# Altium schematic symbol library SparkFun.SCHLIB: 796 symbols (part 1 of 5) (continued)
## BUTTONPAD-4X4 (continued)
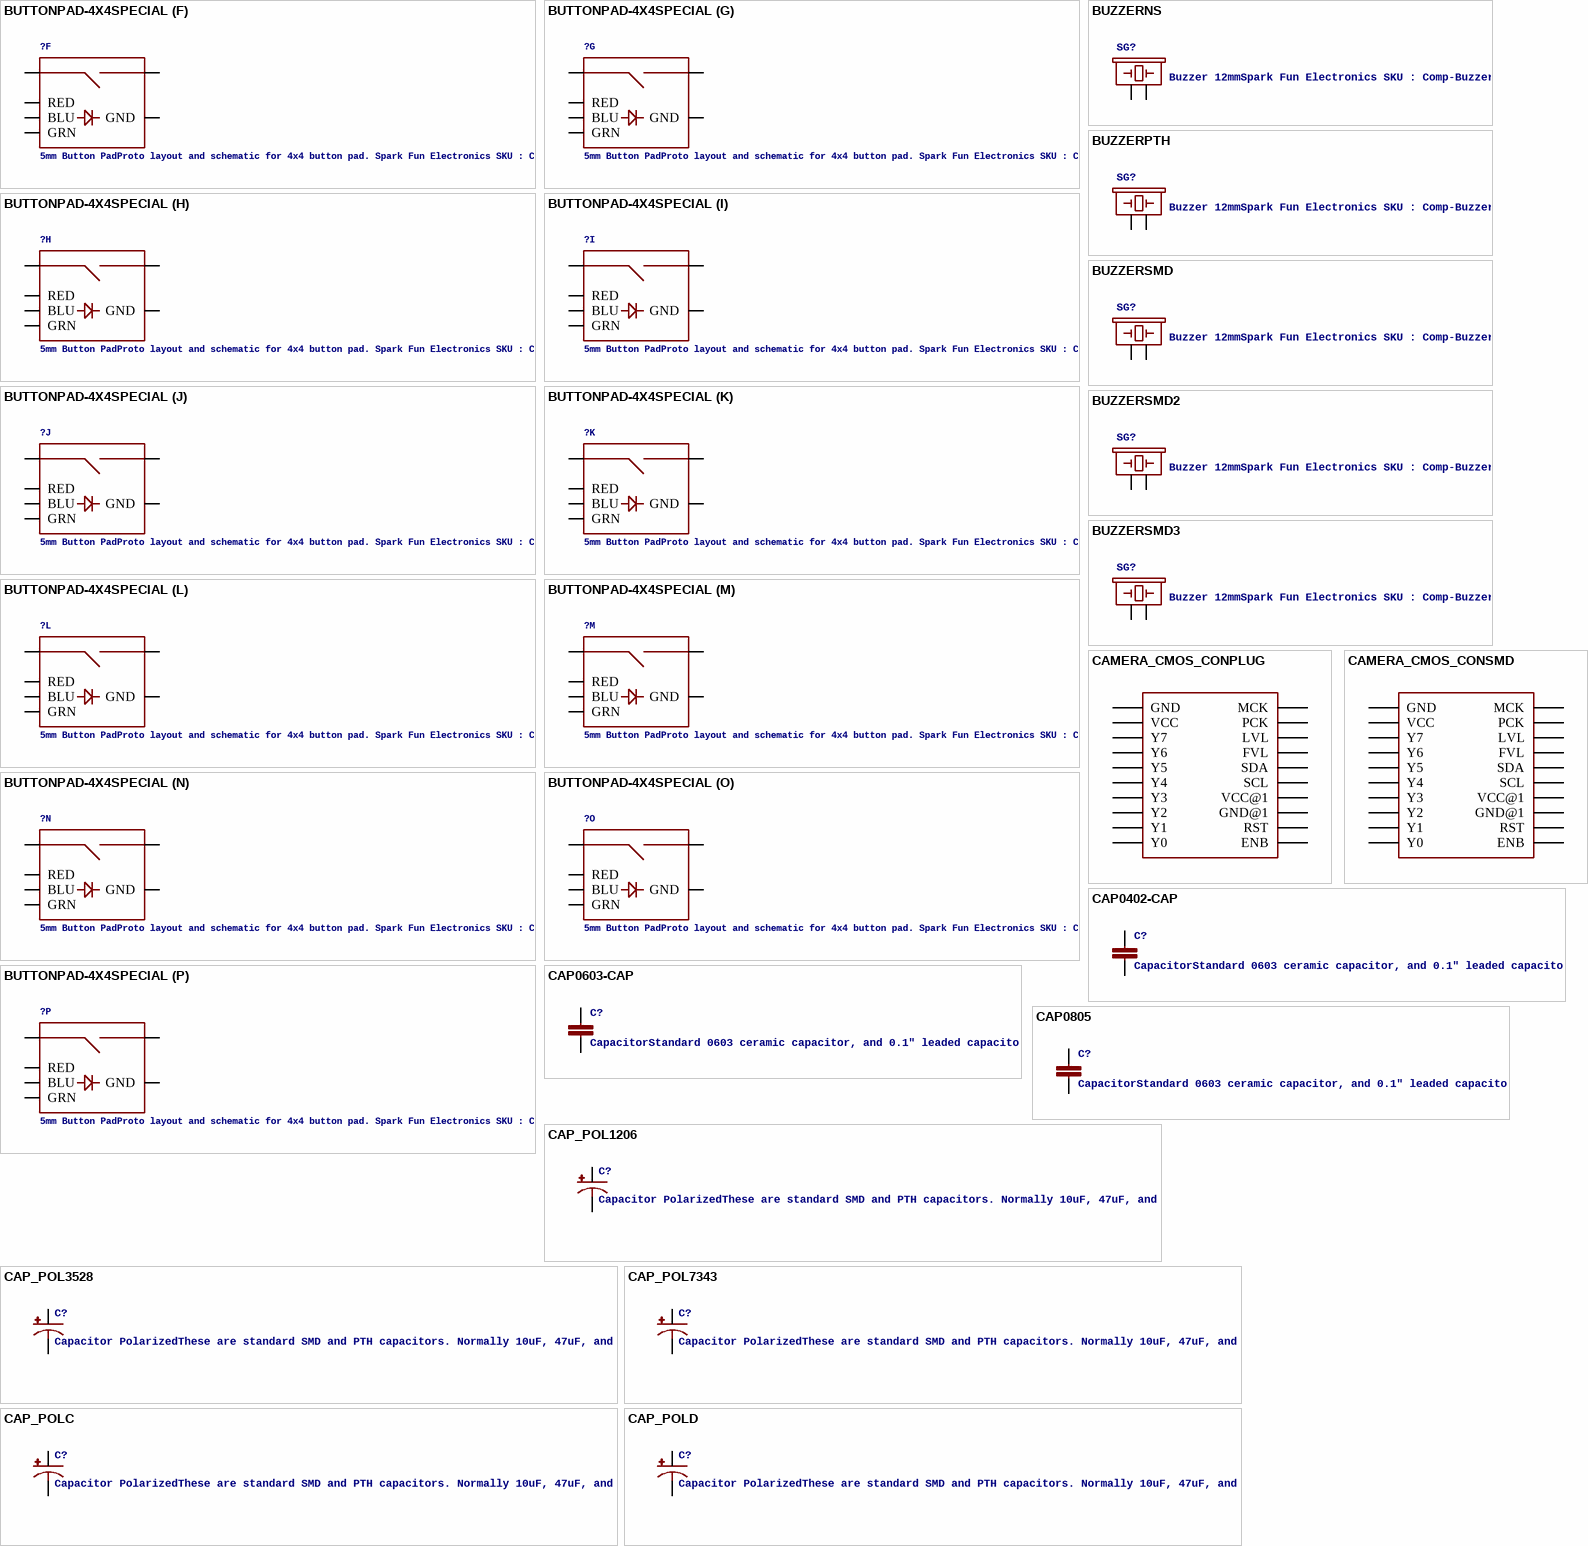
[diagram p8: symbols BUTTONPAD-4X4SPECIAL to CAP_POLD]

## BUTTONPAD-4X4SPECIAL
designator ?, comment 5mm Button PadProto layout and schematic for 4x4 button pad. Spark Fun Electronics SKU : COM-07835. Compatible common cathode tri-color LED SKU : COM-00105
footprint BUTTONPAD-4X4-SPECIAL
part A pins: BLU0 BLU, GND0 GND, GRN0 GRN, RED0 RED, SIG0 SIG1, SIG1 SIG2
part B pins: BLU1 BLU, GND1 GND, GRN1 GRN, RED1 RED, SIG2 SIG1, SIG3 SIG2
part C pins: BLU2 BLU, GND2 GND, GRN2 GRN, RED2 RED, SIG4 SIG1, SIG5 SIG2
part D pins: BLU3 BLU, GND3 GND, GRN3 GRN, RED3 RED, SIG6 SIG1, SIG7 SIG2
part E pins: BLU4 BLU, GND4 GND, GRN4 GRN, RED4 RED, SIG8 SIG1, SIG9 SIG2
part F pins: BLU5 BLU, GND5 GND, GRN6 GRN, RED5 RED, SIG10 SIG1, SIG11 SIG2
part G pins: BLU6 BLU, GND6 GND, GRN5 GRN, RED6 RED, SIG12 SIG1, SIG13 SIG2
part H pins: BLU7 BLU, GND7 GND, GRN7 GRN, RED7 RED, SIG14 SIG1, SIG15 SIG2
part I pins: BLU8 BLU, GND8 GND, GRN8 GRN, RED8 RED, SIG16 SIG1, SIG17 SIG2
part J pins: BLU9 BLU, GND9 GND, GRN9 GRN, RED9 RED, SIG18 SIG1, SIG19 SIG2
part K pins: BLU10 BLU, GND10 GND, GRN10 GRN, RED10 RED, SIG20 SIG1, SIG21 SIG2
part L pins: BLU11 BLU, GND11 GND, GRN11 GRN, RED11 RED, SIG22 SIG1, SIG23 SIG2
part M pins: BLU12 BLU, GND12 GND, GRN12 GRN, RED12 RED, SIG24 SIG1, SIG25 SIG2
part N pins: BLU13 BLU, GND13 GND, GRN13 GRN, RED13 RED, SIG26 SIG1, SIG27 SIG2
part O pins: BLU14 BLU, GND14 GND, GRN14 GRN, RED14 RED, SIG28 SIG1, SIG29 SIG2
part P pins: BLU15 BLU, GND15 GND, GRN15 GRN, RED15 RED, SIG30 SIG1, SIG31 SIG2

## BUZZERNS
designator SG?, comment Buzzer 12mmSpark Fun Electronics SKU : Comp-Buzzer
footprint BUZZER-12MM-NS
pins: + 1, - 2

## BUZZERPTH
designator SG?, comment Buzzer 12mmSpark Fun Electronics SKU : Comp-Buzzer
footprint BUZZER-12MM
pins: + 1, - 2

## BUZZERSMD
designator SG?, comment Buzzer 12mmSpark Fun Electronics SKU : Comp-Buzzer
footprint BUZZER-CMT1603
pins: P$1 1, P$2 2

## BUZZERSMD2
designator SG?, comment Buzzer 12mmSpark Fun Electronics SKU : Comp-Buzzer
footprint BUZZER-CCV
pins: + 1, - 2

## BUZZERSMD3
designator SG?, comment Buzzer 12mmSpark Fun Electronics SKU : Comp-Buzzer
footprint BUZZER-CMT1102
pins: 1, 2

## CAMERA_CMOS_CONPLUG
designator ?, comment 640x480 CMOS Color CameraFootprint proven. Spark Fun Electronics Camera SKU : SEN-00637, Mating Connector SKU : SEN-00638  (value not drawn)
footprint CAMERA_CMOS_PLUG
pins: 1 Y0, 2 Y1, 3 Y2, 4 Y3, 5 Y4, 6 Y5, 7 Y6, 8 Y7, 9 VCC, 10 GND, 11 ENB, 12 RST, 13 GND@1, 14 VCC@1, 15 SCL, 16 SDA, 17 FVL, 18 LVL, 19 PCK, 20 MCK

## CAMERA_CMOS_CONSMD
designator ?, comment 640x480 CMOS Color CameraFootprint proven. Spark Fun Electronics Camera SKU : SEN-00637, Mating Connector SKU : SEN-00638  (value not drawn)
footprint CAMERA_CMOS_CON
pins: ENB, FVLD FVL, GND, GND@1, LVLD LVL, MCLK MCK, PCLK PCK, RST, SCL, SDA, VCC, VCC@1, Y0, Y1, Y2, Y3, Y4, Y5, Y6, Y7

## CAP0402-CAP
designator C?, comment CapacitorStandard 0603 ceramic capacitor, and 0.1" leaded capacitor.
footprint 0402-CAP
pins: 1, 2

## CAP0603-CAP
designator C?, comment CapacitorStandard 0603 ceramic capacitor, and 0.1" leaded capacitor.
footprint 0603-CAP
pins: 1, 2

## CAP0805
designator C?, comment CapacitorStandard 0603 ceramic capacitor, and 0.1" leaded capacitor.
footprint 0805
pins: 1, 2

## CAP_POL1206
designator C?, comment Capacitor PolarizedThese are standard SMD and PTH capacitors. Normally 10uF, 47uF, and 100uF in electrolytic and tantalum varieties. Always verify the external diameter of the through hole cap, it varies with capacity, voltage, and manufacturer. The EIA devices should be standard.
footprint EIA3216
pins: A +, C -

## CAP_POL3528
designator C?, comment Capacitor PolarizedThese are standard SMD and PTH capacitors. Normally 10uF, 47uF, and 100uF in electrolytic and tantalum varieties. Always verify the external diameter of the through hole cap, it varies with capacity, voltage, and manufacturer. The EIA devices should be standard.
footprint EIA3528
pins: A +, C -

## CAP_POL7343
designator C?, comment Capacitor PolarizedThese are standard SMD and PTH capacitors. Normally 10uF, 47uF, and 100uF in electrolytic and tantalum varieties. Always verify the external diameter of the through hole cap, it varies with capacity, voltage, and manufacturer. The EIA devices should be standard.
footprint EIA7343
pins: A +, C -

## CAP_POLC
designator C?, comment Capacitor PolarizedThese are standard SMD and PTH capacitors. Normally 10uF, 47uF, and 100uF in electrolytic and tantalum varieties. Always verify the external diameter of the through hole cap, it varies with capacity, voltage, and manufacturer. The EIA devices should be standard.
footprint PANASONIC_C
pins: +, -

## CAP_POLD
designator C?, comment Capacitor PolarizedThese are standard SMD and PTH capacitors. Normally 10uF, 47uF, and 100uF in electrolytic and tantalum varieties. Always verify the external diameter of the through hole cap, it varies with capacity, voltage, and manufacturer. The EIA devices should be standard.
footprint PANASONIC_D
pins: +, -

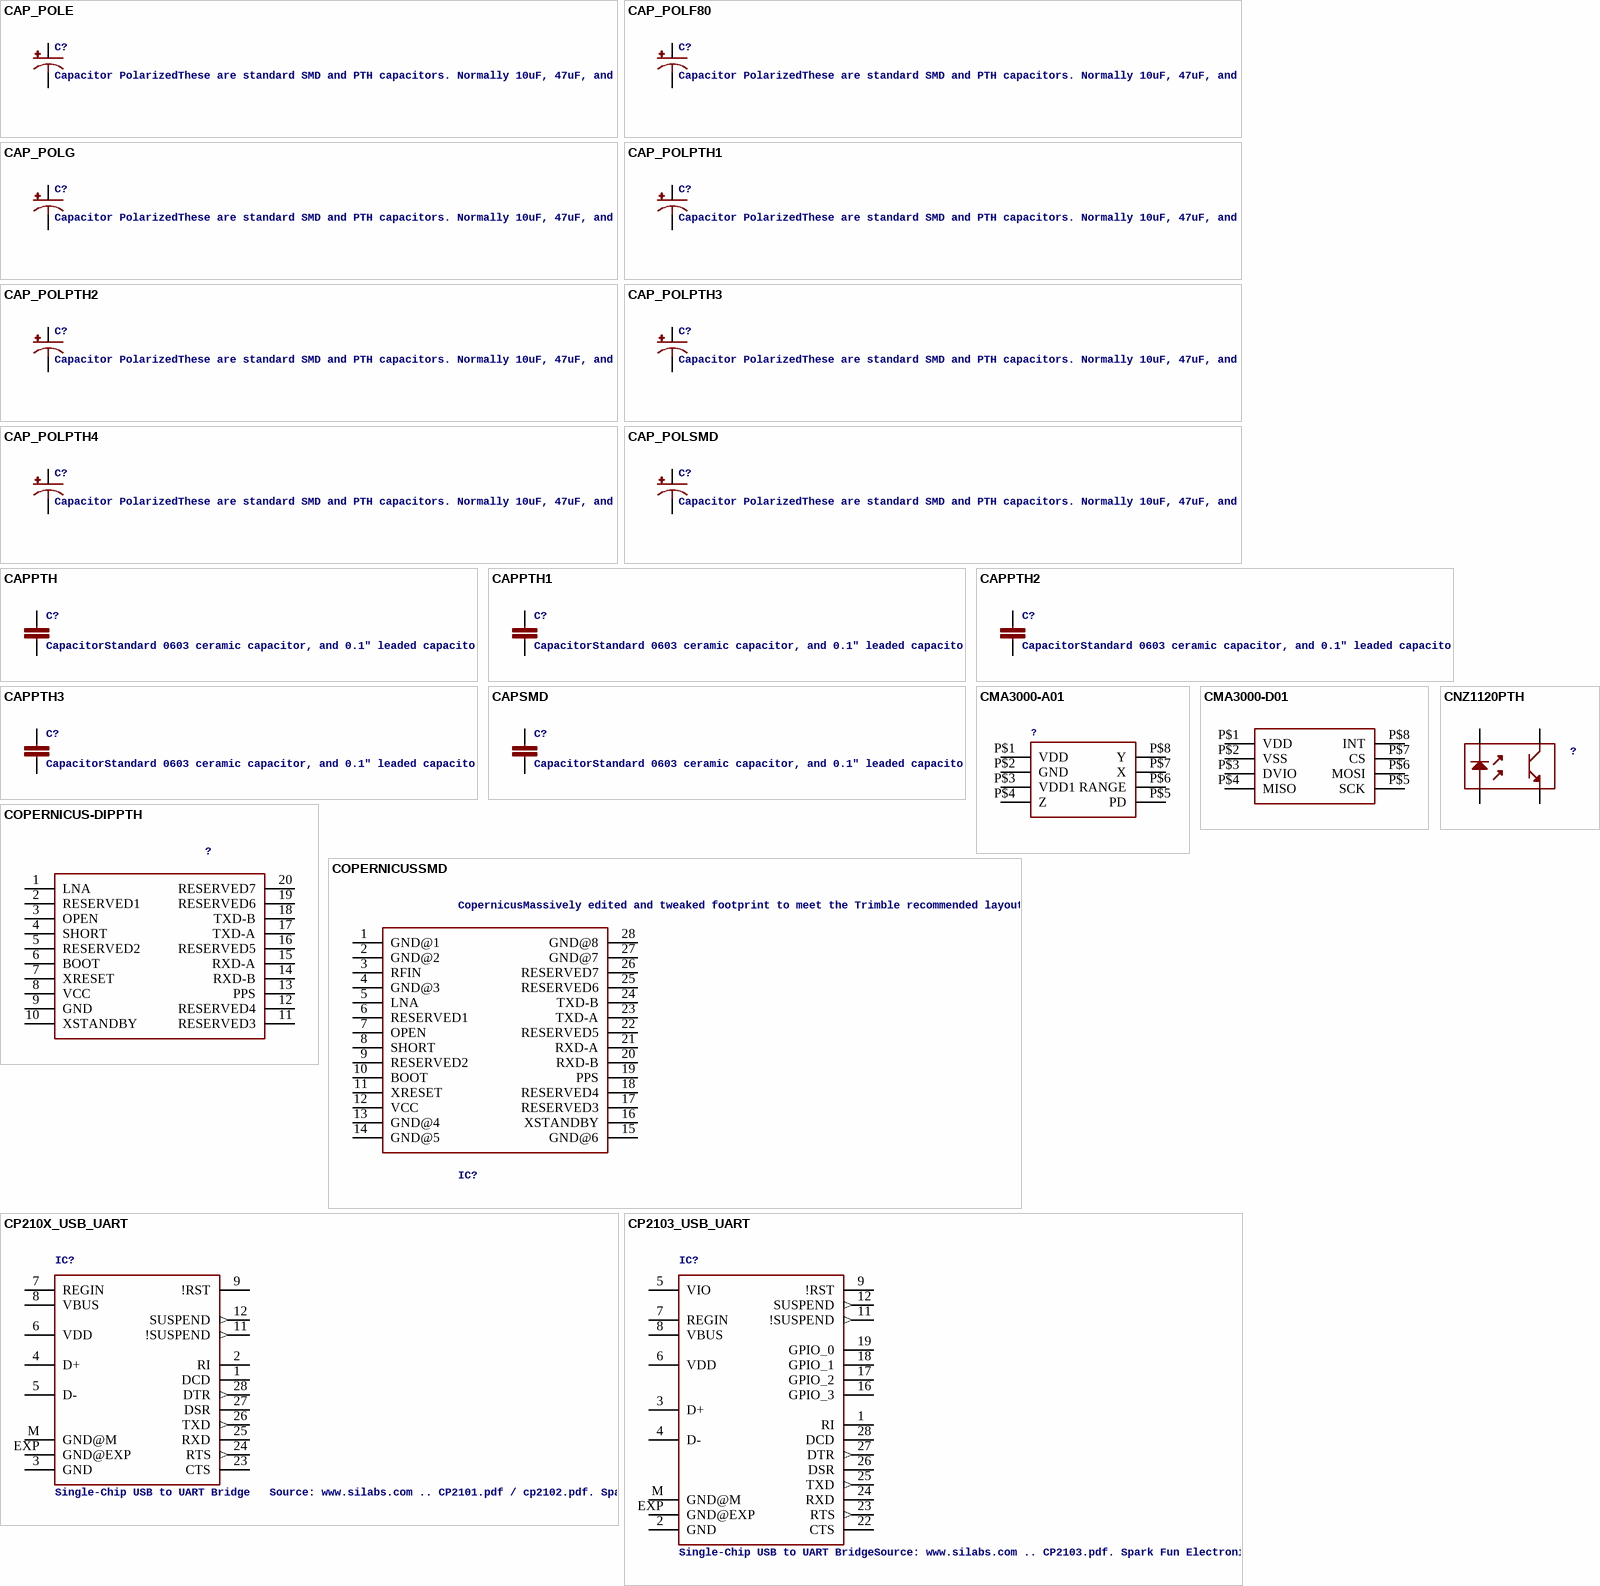
[diagram p9: symbols CAP_POLE to CP2103_USB_UART]

## CAP_POLE
designator C?, comment Capacitor PolarizedThese are standard SMD and PTH capacitors. Normally 10uF, 47uF, and 100uF in electrolytic and tantalum varieties. Always verify the external diameter of the through hole cap, it varies with capacity, voltage, and manufacturer. The EIA devices should be standard.
footprint PANASONIC_E
pins: +, -

## CAP_POLF80
designator C?, comment Capacitor PolarizedThese are standard SMD and PTH capacitors. Normally 10uF, 47uF, and 100uF in electrolytic and tantalum varieties. Always verify the external diameter of the through hole cap, it varies with capacity, voltage, and manufacturer. The EIA devices should be standard.
footprint NIPPON_F80
pins: +, -

## CAP_POLG
designator C?, comment Capacitor PolarizedThese are standard SMD and PTH capacitors. Normally 10uF, 47uF, and 100uF in electrolytic and tantalum varieties. Always verify the external diameter of the through hole cap, it varies with capacity, voltage, and manufacturer. The EIA devices should be standard.
footprint PANASONIC_G
pins: +, -

## CAP_POLPTH1
designator C?, comment Capacitor PolarizedThese are standard SMD and PTH capacitors. Normally 10uF, 47uF, and 100uF in electrolytic and tantalum varieties. Always verify the external diameter of the through hole cap, it varies with capacity, voltage, and manufacturer. The EIA devices should be standard.
footprint CPOL-RADIAL-100UF-25V
pins: 1 +, 2 -

## CAP_POLPTH2
designator C?, comment Capacitor PolarizedThese are standard SMD and PTH capacitors. Normally 10uF, 47uF, and 100uF in electrolytic and tantalum varieties. Always verify the external diameter of the through hole cap, it varies with capacity, voltage, and manufacturer. The EIA devices should be standard.
footprint CPOL-RADIAL-10UF-25V
pins: 1 +, 2 -

## CAP_POLPTH3
designator C?, comment Capacitor PolarizedThese are standard SMD and PTH capacitors. Normally 10uF, 47uF, and 100uF in electrolytic and tantalum varieties. Always verify the external diameter of the through hole cap, it varies with capacity, voltage, and manufacturer. The EIA devices should be standard.
footprint CPOL-RADIAL-1000UF-63V
pins: 1 +, 2 -

## CAP_POLPTH4
designator C?, comment Capacitor PolarizedThese are standard SMD and PTH capacitors. Normally 10uF, 47uF, and 100uF in electrolytic and tantalum varieties. Always verify the external diameter of the through hole cap, it varies with capacity, voltage, and manufacturer. The EIA devices should be standard.
footprint CPOL-RADIAL-1000UF-25V
pins: 1 +, 2 -

## CAP_POLSMD
designator C?, comment Capacitor PolarizedThese are standard SMD and PTH capacitors. Normally 10uF, 47uF, and 100uF in electrolytic and tantalum varieties. Always verify the external diameter of the through hole cap, it varies with capacity, voltage, and manufacturer. The EIA devices should be standard.
footprint VISHAY_C
pins: +, -

## CAPPTH
designator C?, comment CapacitorStandard 0603 ceramic capacitor, and 0.1" leaded capacitor.
footprint CAP-PTH-SMALL
pins: 1, 2

## CAPPTH1
designator C?, comment CapacitorStandard 0603 ceramic capacitor, and 0.1" leaded capacitor.
footprint CAP-PTH-5MM
pins: 1, 2

## CAPPTH2
designator C?, comment CapacitorStandard 0603 ceramic capacitor, and 0.1" leaded capacitor.
footprint CAP-PTH-SMALL2
pins: 1, 2

## CAPPTH3
designator C?, comment CapacitorStandard 0603 ceramic capacitor, and 0.1" leaded capacitor.
footprint CAP-PTH-LARGE
pins: 1, 2

## CAPSMD
designator C?, comment CapacitorStandard 0603 ceramic capacitor, and 0.1" leaded capacitor.
footprint GRM43D
pins: A 1, C 2

## CMA3000-A01
designator ?
footprint CMA3000
pins: P$1 VDD, P$2 GND, P$3 VDD1, P$4 Z, P$5 PD, P$6 RANGE, P$7 X, P$8 Y

## CMA3000-D01
designator ?
footprint CMA3000
pins: P$1 VDD, P$2 VSS, P$3 DVIO, P$4 MISO, P$5 SCK, P$6 MOSI, P$7 CS, P$8 INT

## CNZ1120PTH
designator ?
footprint CNZ1120
pins: 1, 2, 3, 4

## COPERNICUS-DIPPTH
designator ?
footprint COPERNICUS-DIP
pins: 1 LNA, 2 RESERVED1, 3 OPEN, 4 SHORT, 5 RESERVED2, 6 BOOT, 7 XRESET, 8 VCC, 9 GND, 10 XSTANDBY, 11 RESERVED3, 12 RESERVED4, 13 PPS, 14 RXD-B, 15 RXD-A, 16 RESERVED5, 17 TXD-A, 18 TXD-B, 19 RESERVED6, 20 RESERVED7

## COPERNICUSSMD
designator IC?, comment CopernicusMassively edited and tweaked footprint to meet the Trimble recommended layout and paste layer. Footprint production proven. Spark Fun Electronics SKU : GPS-07951
footprint COPERNICUS
pins: 1 GND@1, 2 GND@2, 3 RFIN, 4 GND@3, 5 LNA, 6 RESERVED1, 7 OPEN, 8 SHORT, 9 RESERVED2, 10 BOOT, 11 XRESET, 12 VCC, 13 GND@4, 14 GND@5, 15 GND@6, 16 XSTANDBY, 17 RESERVED3, 18 RESERVED4, 19 PPS, 20 RXD-B, 21 RXD-A, 22 RESERVED5, 23 TXD-A, 24 TXD-B, 25 RESERVED6, 26 RESERVED7, 27 GND@7, 28 GND@8

## CP210X_USB_UART
designator IC?, comment Single-Chip USB to UART Bridge   Source: www.silabs.com .. CP2101.pdf / cp2102.pdf. Spark Fun Electronics SKU : COM-00310
footprint MLP28
pins: 1 DCD, 2 RI, 3 GND (power), 4 D+, 5 D-, 6 VDD (power), 7 REGIN, 8 VBUS, 9 !RST, 11 !SUSPEND (out), 12 SUSPEND (out), 23 CTS, 24 RTS (out), 25 RXD, 26 TXD (out), 27 DSR, 28 DTR (out), EXP GND@EXP (power), M GND@M (power)

## CP2103_USB_UART
designator IC?, comment Single-Chip USB to UART BridgeSource: www.silabs.com .. CP2103.pdf. Spark Fun Electronics SKU : COM-00309
footprint MLP28
pins: 1 RI, 2 GND (power), 3 D+, 4 D-, 5 VIO (power), 6 VDD (power), 7 REGIN, 8 VBUS, 9 !RST, 11 !SUSPEND (out), 12 SUSPEND (out), 16 GPIO_3, 17 GPIO_2, 18 GPIO_1, 19 GPIO_0, 22 CTS, 23 RTS (out), 24 RXD, 25 TXD (out), 26 DSR, 27 DTR (out), 28 DCD, EXP GND@EXP (power), M GND@M (power)

## CREATIVE_COMMONS
designator ?
footprint CREATIVE_COMMONS

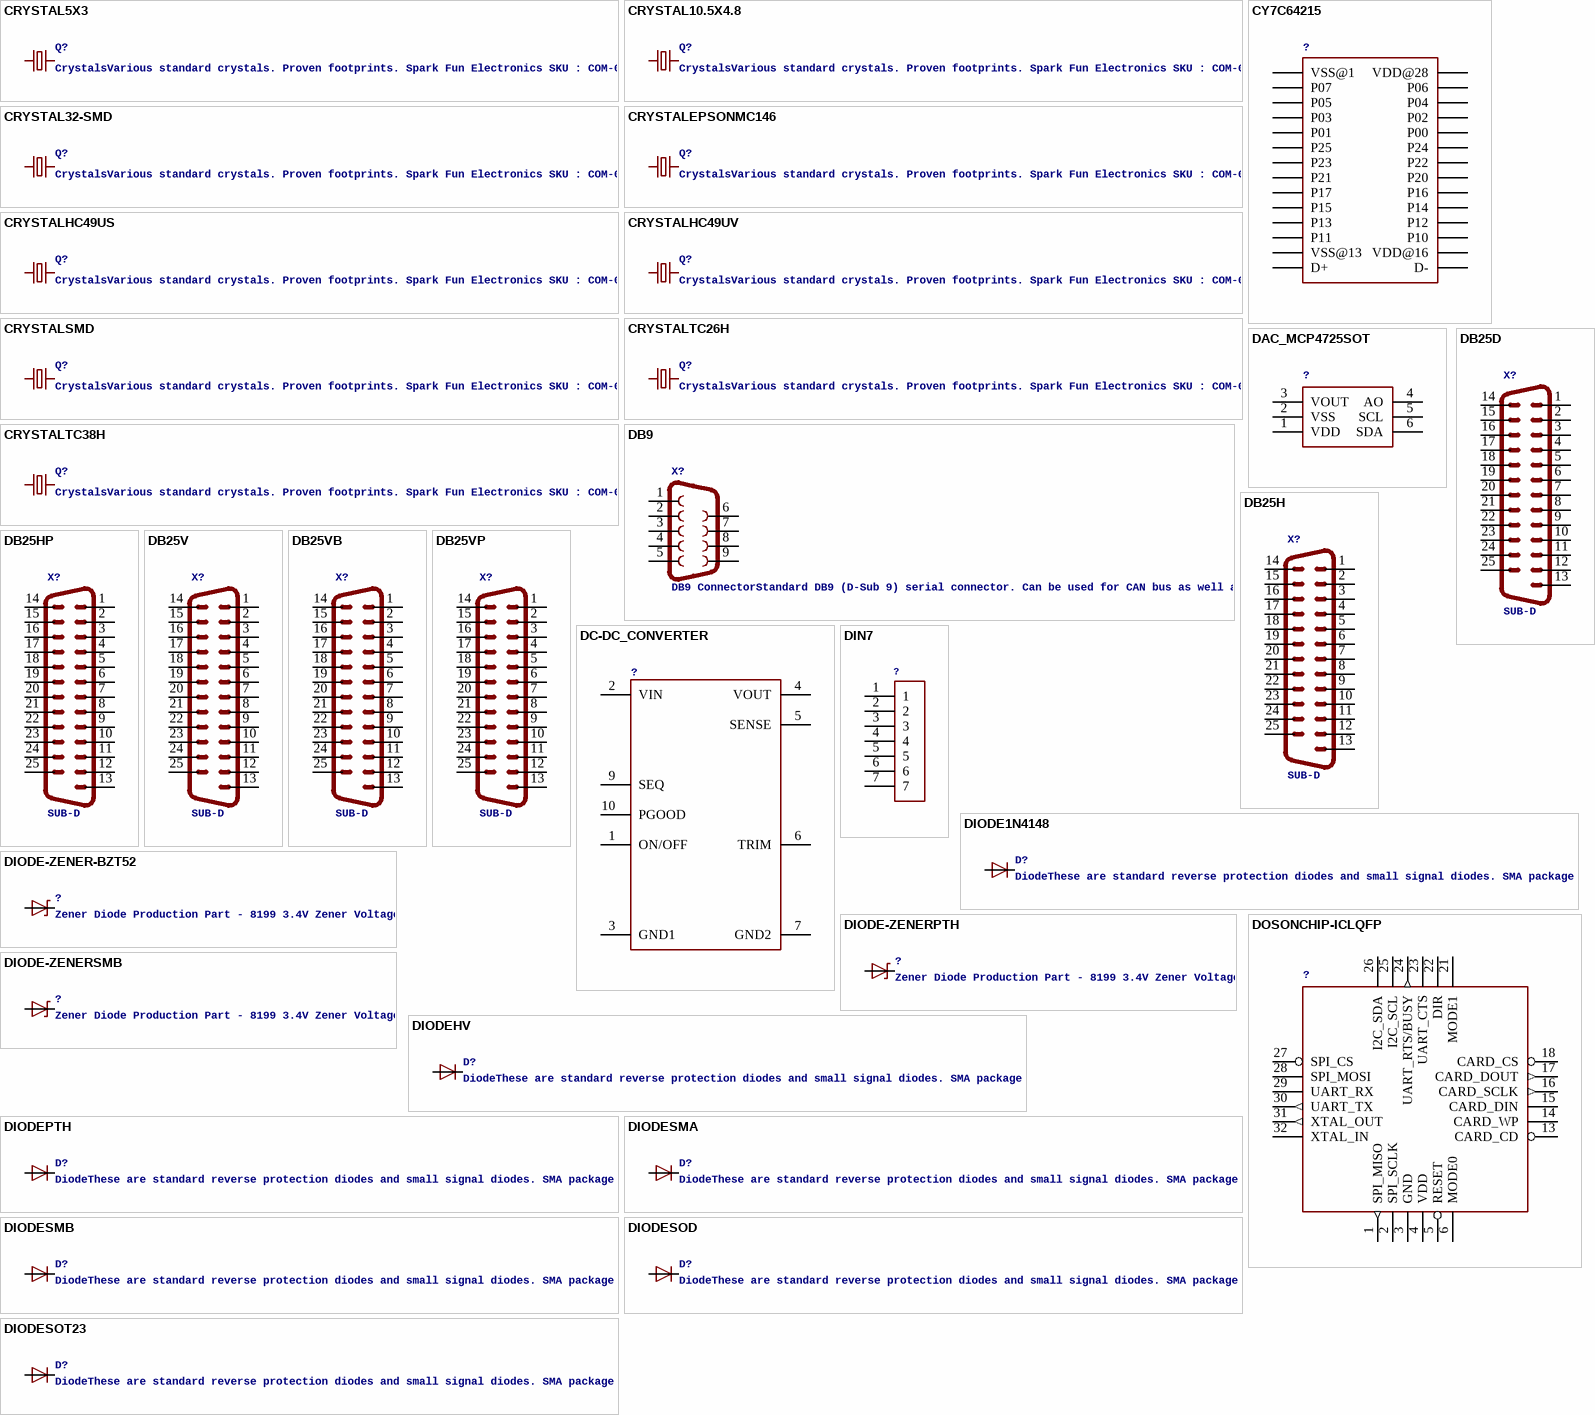
[diagram p10: symbols CRYSTAL5X3 to DOSONCHIP-ICLQFP]

## CRYSTAL5X3
designator Q?, comment CrystalsVarious standard crystals. Proven footprints. Spark Fun Electronics SKU : COM-00534
footprint CRYSTAL-SMD-5X3
pins: 1, 3 2

## CRYSTAL10.5X4.8
designator Q?, comment CrystalsVarious standard crystals. Proven footprints. Spark Fun Electronics SKU : COM-00534
footprint CRYSTAL-SMD-10.5X4.8-2PIN
pins: P$1 1, P$2 2

## CRYSTAL32-SMD
designator Q?, comment CrystalsVarious standard crystals. Proven footprints. Spark Fun Electronics SKU : COM-00534
footprint CRYSTAL-32KHZ-SMD
pins: X1 1, X2 2

## CRYSTALEPSONMC146
designator Q?, comment CrystalsVarious standard crystals. Proven footprints. Spark Fun Electronics SKU : COM-00534
footprint CRYSTAL-32KHZ-SMD_EPSON_MC146
pins: P$1 2, P$2 1

## CRYSTALHC49US
designator Q?, comment CrystalsVarious standard crystals. Proven footprints. Spark Fun Electronics SKU : COM-00534
footprint HC49US
pins: 1, 2

## CRYSTALHC49UV
designator Q?, comment CrystalsVarious standard crystals. Proven footprints. Spark Fun Electronics SKU : COM-00534
footprint HC49U-V
pins: 1, 2

## CRYSTALSMD
designator Q?, comment CrystalsVarious standard crystals. Proven footprints. Spark Fun Electronics SKU : COM-00534
footprint HC49UP
pins: 1, 2

## CRYSTALTC26H
designator Q?, comment CrystalsVarious standard crystals. Proven footprints. Spark Fun Electronics SKU : COM-00534
footprint TC26H
pins: 1, 2

## CRYSTALTC38H
designator Q?, comment CrystalsVarious standard crystals. Proven footprints. Spark Fun Electronics SKU : COM-00534
footprint TC38H
pins: 1, 2

## CY7C64215
designator ?
footprint SSOP28DB
pins: 1 VSS@1, 2 P07, 3 P05, 4 P03, 5 P01, 6 P25, 7 P23, 8 P21, 9 P17, 10 P15, 11 P13, 12 P11, 13 VSS@13, 14 D+, 15 D-, 16 VDD@16, 17 P10, 18 P12, 19 P14, 20 P16, 21 P20, 22 P22, 23 P24, 24 P00, 25 P02, 26 P04, 27 P06, 28 VDD@28

## DAC_MCP4725SOT
designator ?
footprint SOT23-6
pins: 1 VDD, 2 VSS, 3 VOUT, 4 AO, 5 SCL, 6 SDA

## DB9
designator X?, comment DB9 ConnectorStandard DB9 (D-Sub 9) serial connector. Can be used for CAN bus as well as RS485 and RS232. Footprint production proven. Spark Fun Electronics SKU : PRT-00429
footprint DB9
pins: 1, 2, 3, 4, 5, 6, 7, 8, 9

## DB25D
designator X?, comment SUB-D
footprint M25D
pins: 1, 2, 3, 4, 5, 6, 7, 8, 9, 10, 11, 12, 13, 14, 15, 16, 17, 18, 19, 20, 21, 22, 23, 24, 25

## DB25H
designator X?, comment SUB-D
footprint M25H
pins: 1, 2, 3, 4, 5, 6, 7, 8, 9, 10, 11, 12, 13, 14, 15, 16, 17, 18, 19, 20, 21, 22, 23, 24, 25

## DB25HP
designator X?, comment SUB-D
footprint M25HP
pins: 1, 2, 3, 4, 5, 6, 7, 8, 9, 10, 11, 12, 13, 14, 15, 16, 17, 18, 19, 20, 21, 22, 23, 24, 25

## DB25V
designator X?, comment SUB-D
footprint M25V
pins: 1, 2, 3, 4, 5, 6, 7, 8, 9, 10, 11, 12, 13, 14, 15, 16, 17, 18, 19, 20, 21, 22, 23, 24, 25

## DB25VB
designator X?, comment SUB-D
footprint M25VB
pins: 1, 2, 3, 4, 5, 6, 7, 8, 9, 10, 11, 12, 13, 14, 15, 16, 17, 18, 19, 20, 21, 22, 23, 24, 25

## DB25VP
designator X?, comment SUB-D
footprint M25VP
pins: 1, 2, 3, 4, 5, 6, 7, 8, 9, 10, 11, 12, 13, 14, 15, 16, 17, 18, 19, 20, 21, 22, 23, 24, 25

## DC-DC_CONVERTER
designator ?
footprint DC-DC_CONVERTER
pins: 1 ON/OFF, 2 VIN, 3 GND1, 4 VOUT, 5 SENSE, 6 TRIM, 7 GND2, 9 SEQ, 10 PGOOD

## DIN7
designator ?
footprint DIN7
pins: 1, 2, 3, 4, 5, 6, 7

## DIODE1N4148
designator D?, comment DiodeThese are standard reverse protection diodes and small signal diodes. SMA package can handle up to about 1A. SOD-323 can handle about 200mA. What the SOD-323 package when ordering, there are some mfgs out there that are 5-pin packages.
footprint DIODE-1N4148
pins: A, C

## DIODE-ZENER-BZT52
designator ?, comment Zener Diode Production Part - 8199 3.4V Zener Voltage
footprint SOD-323
pins: 1 C, 2 A

## DIODE-ZENERPTH
designator ?, comment Zener Diode Production Part - 8199 3.4V Zener Voltage
footprint DIODE-ZENER
pins: P$1 C, P$2 A

## DIODE-ZENERSMB
designator ?, comment Zener Diode Production Part - 8199 3.4V Zener Voltage
footprint SMB-DIODE
pins: A, C

## DIODEHV
designator D?, comment DiodeThese are standard reverse protection diodes and small signal diodes. SMA package can handle up to about 1A. SOD-323 can handle about 200mA. What the SOD-323 package when ordering, there are some mfgs out there that are 5-pin packages.
footprint DIODE-HV
pins: A, C

## DIODEPTH
designator D?, comment DiodeThese are standard reverse protection diodes and small signal diodes. SMA package can handle up to about 1A. SOD-323 can handle about 200mA. What the SOD-323 package when ordering, there are some mfgs out there that are 5-pin packages.
footprint DIODE-1N4001
pins: A, C

## DIODESMA
designator D?, comment DiodeThese are standard reverse protection diodes and small signal diodes. SMA package can handle up to about 1A. SOD-323 can handle about 200mA. What the SOD-323 package when ordering, there are some mfgs out there that are 5-pin packages.
footprint SMA-DIODE
pins: A, C

## DIODESMB
designator D?, comment DiodeThese are standard reverse protection diodes and small signal diodes. SMA package can handle up to about 1A. SOD-323 can handle about 200mA. What the SOD-323 package when ordering, there are some mfgs out there that are 5-pin packages.
footprint SMB-DIODE
pins: A, C

## DIODESOD
designator D?, comment DiodeThese are standard reverse protection diodes and small signal diodes. SMA package can handle up to about 1A. SOD-323 can handle about 200mA. What the SOD-323 package when ordering, there are some mfgs out there that are 5-pin packages.
footprint SOD-323
pins: 1 C, 2 A

## DIODESOT23
designator D?, comment DiodeThese are standard reverse protection diodes and small signal diodes. SMA package can handle up to about 1A. SOD-323 can handle about 200mA. What the SOD-323 package when ordering, there are some mfgs out there that are 5-pin packages.
footprint SOT23-3
pins: 1 A, 3 C

## DOSONCHIP-ICLQFP
designator ?, comment DOSonCHIP ICThis is the tested schematic and footprint for the DOSonCHIP FAT16 FAT32 IC. Spark Fun Electronics SKU : COM-07956. QFN package also tested/proven.  (value not drawn)
footprint LQFP-32
pins: 1 SPI_MISO (out), 2 SPI_SCLK, 3 GND, 4 VDD, 5 RESET, 6 MODE0, 13 CARD_CD, 14 CARD_WP, 15 CARD_DIN, 16 CARD_SCLK (out), 17 CARD_DOUT (out), 18 CARD_CS, 21 MODE1, 22 DIR, 23 UART_CTS, 24 UART_RTS/BUSY (out), 25 I2C_SCL, 26 I2C_SDA, 27 SPI_CS, 28 SPI_MOSI, 29 UART_RX, 30 UART_TX (out), 31 XTAL_OUT (out), 32 XTAL_IN

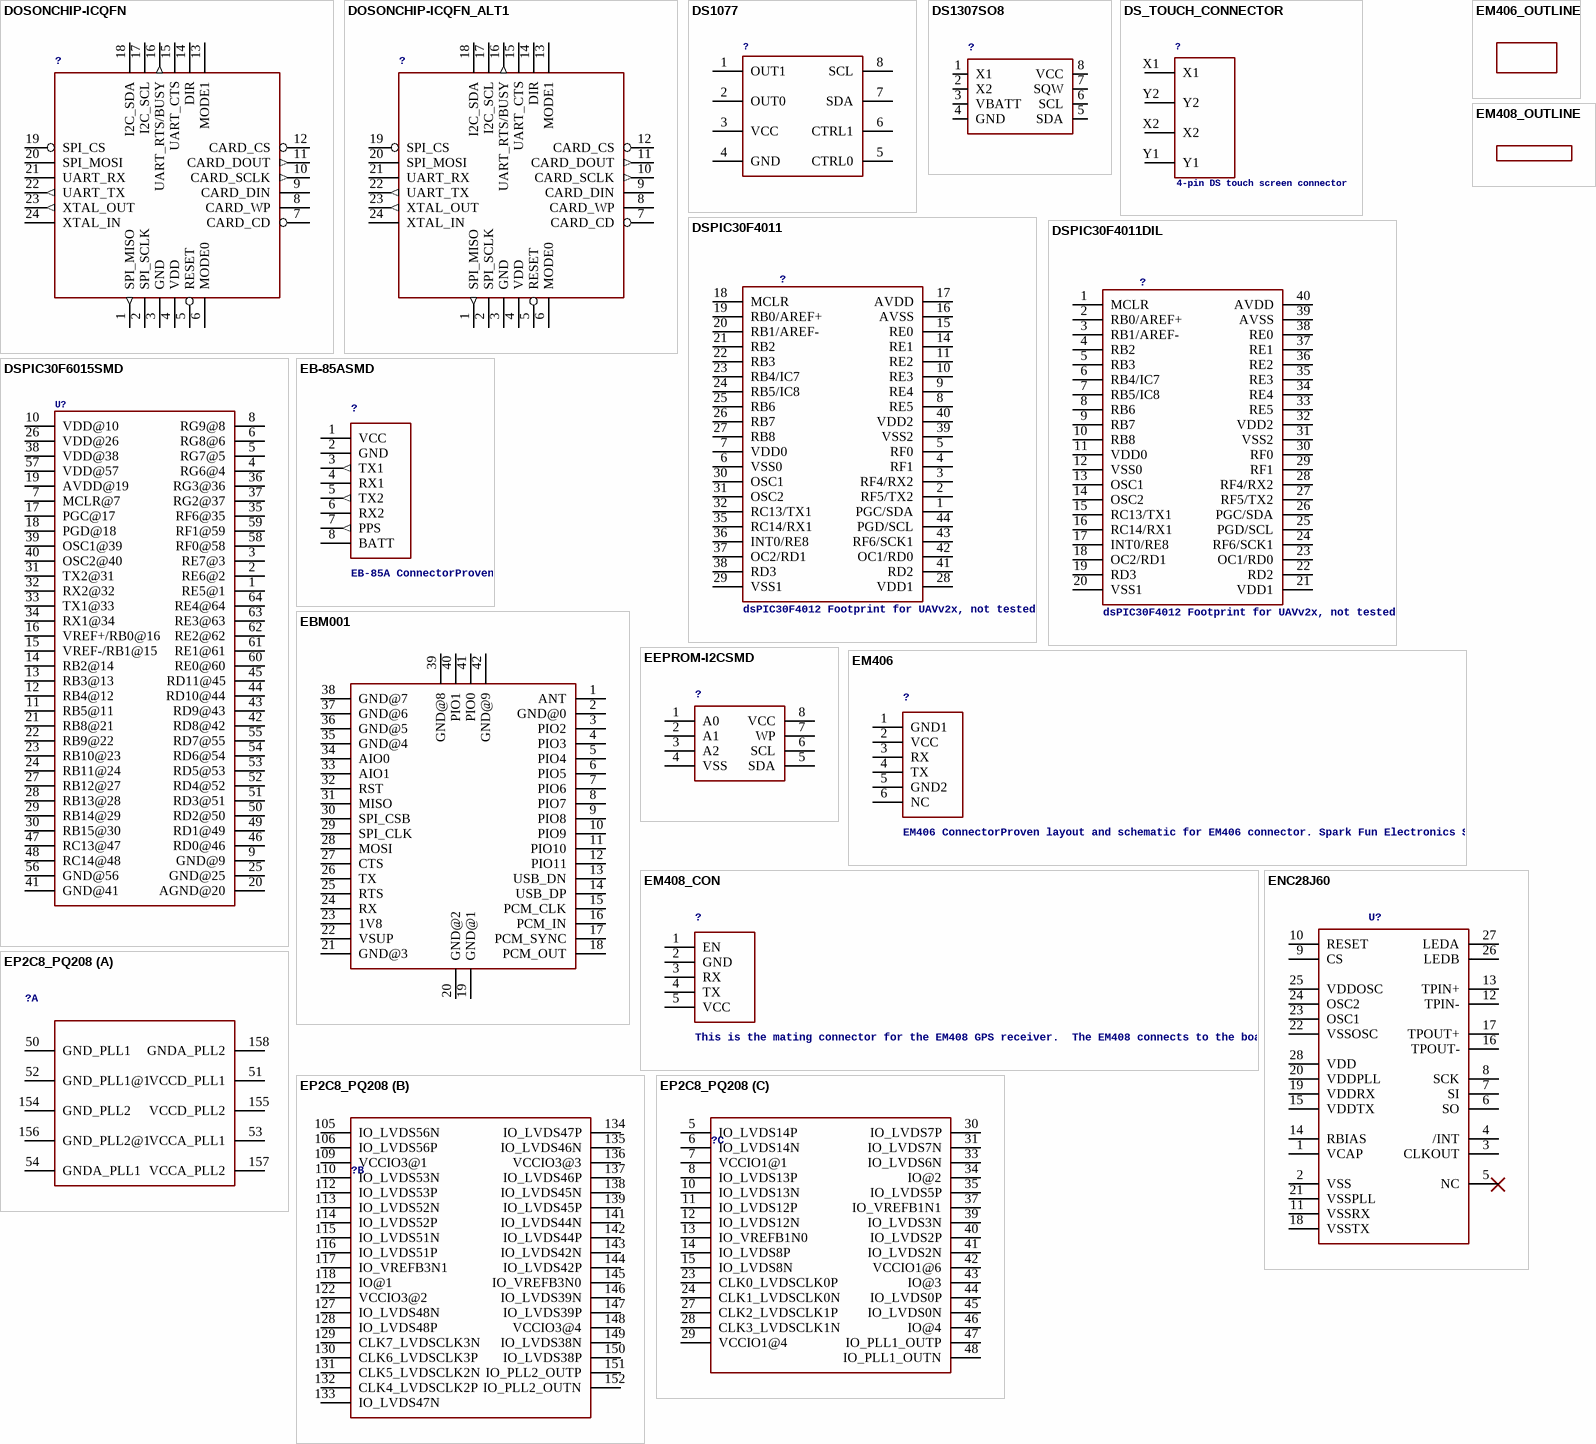
[diagram p11: symbols DOSONCHIP-ICQFN to EP2C8_PQ208]